# Altium footprint library 7.Connectors&Battary_holders.PcbLib: 133 footprints (part 5 of 9)
Each footprint in its own frame and in the unit in brackets; x right, y up, seen from the top. Pads: shape width x height; smd on the part's side, far side on the other; paste and mask are expansions set on the pad; w line width, h text height; cw(c..) or ccw(c..) is an arc to the next point about the centre after c.
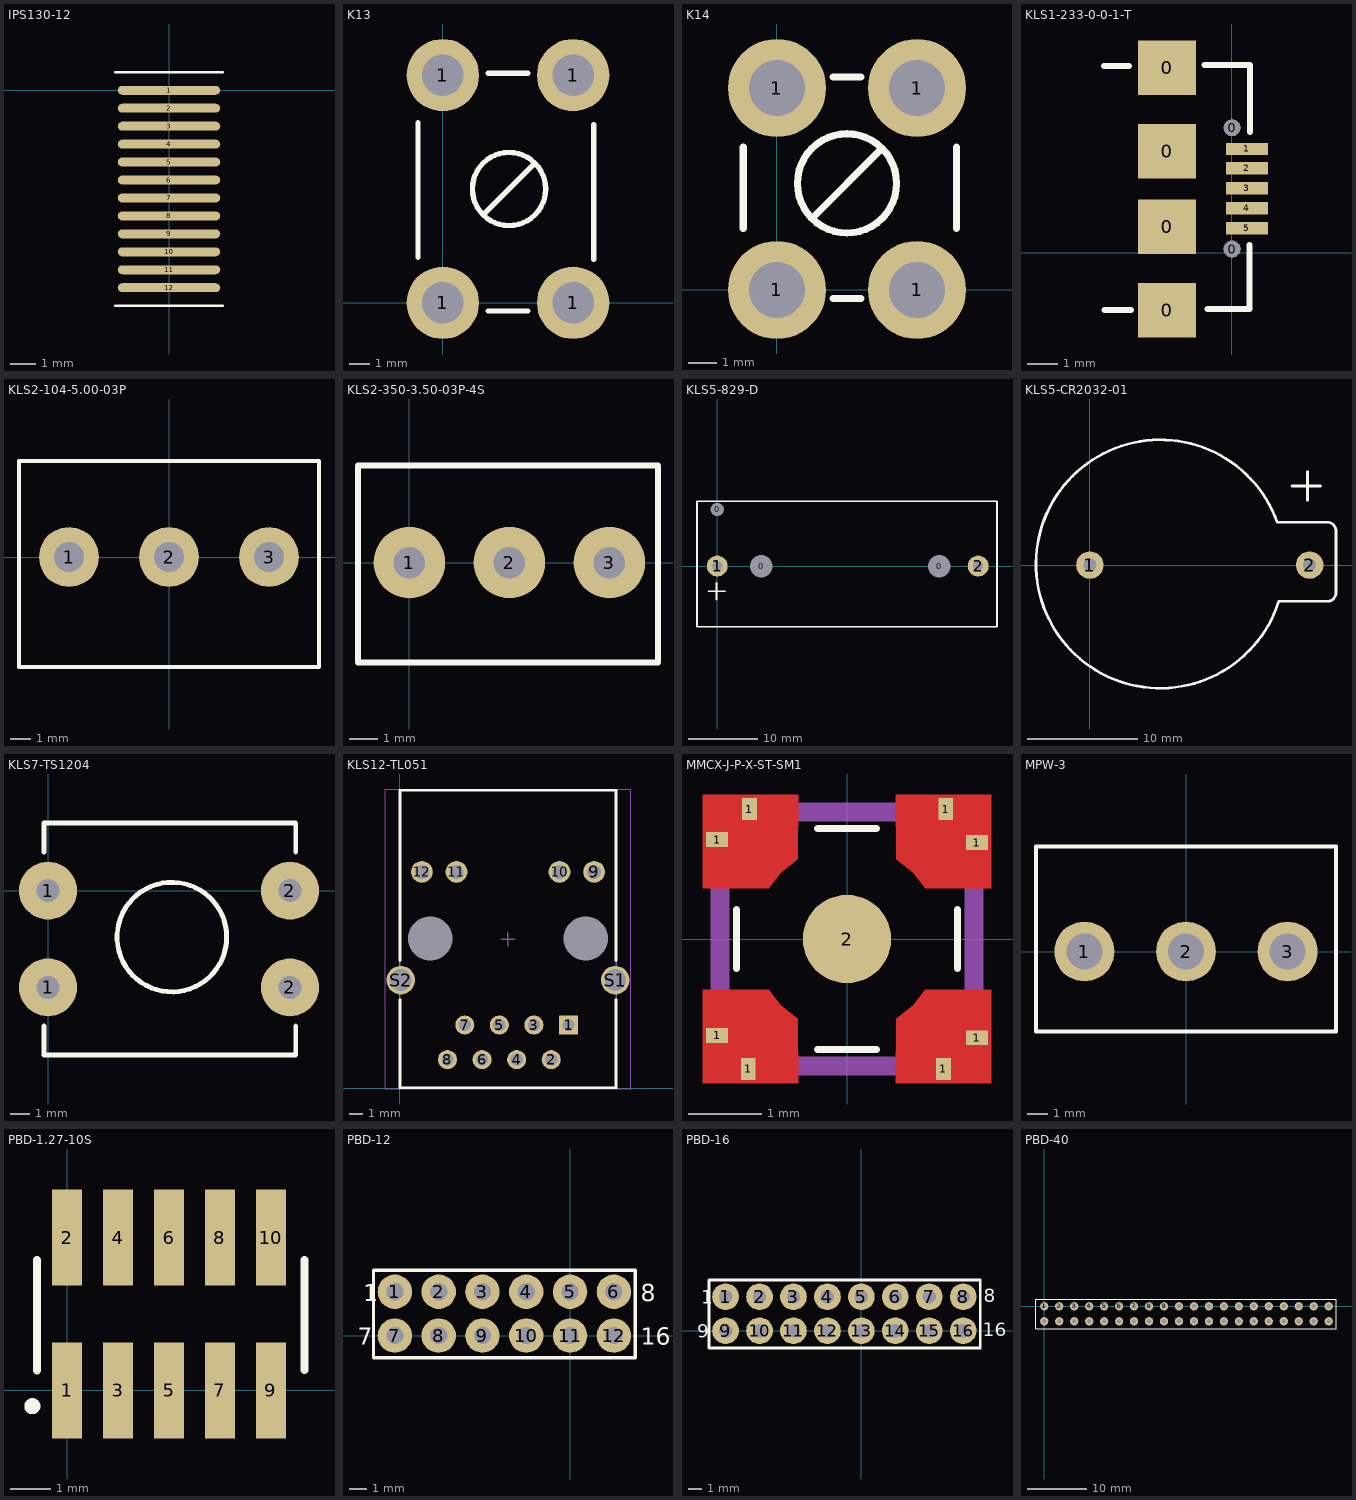
[diagram p4: the footprints below, top view; thin cyan lines are the x and y axes]

## IPS130-12 [mm]
pads (12):
  oval 4x0.35 smd: 1(0,0) 2(0,-0.7) 3(0,-1.4) 4(0,-2.1) 5(0,-2.8) 6(0,-3.5) 7(0,-4.2) 8(0,-4.9) 9(0,-5.6) 10(0,-6.3) 11(0,-7) 12(0,-7.7)
Top Overlay:
  lines w0.1: -2.1,-8.4 2.1,-8.4 ; -2.1,0.7 2.1,0.7

## K13 [mm]
pads (4):
  round 3.5 hole 2: 1(0,0) 1(0,11) 1(6.3,0) 1(6.3,11)
Top Overlay:
  circle w0.254: c3.2,5.5 r1.769
  lines w0.254: -1.2,2.2 -1.2,8.7 ; 1.95,4.25 4.4,6.7 ; 2.2,-0.4 4.1,-0.4 ; 2.2,11.1 4.1,11.1 ; 7.3,2.1 7.3,8.6
3D body: height 5, standoff 0, extent -1.2,-0.2 7.4,11.2

## K14 [mm]
pads (4):
  round 3.5 hole 2: 1(0,0) 1(0,7.2) 1(5,0) 1(5,7.2)
Top Overlay:
  circle w0.254: c2.5,3.8 r1.769
  lines w0.254: -1.2,2.2 -1.2,5.1 ; 1.25,2.55 3.7,5 ; 2,-0.3 3,-0.3 ; 2,7.6 3,7.6 ; 6.4,2.2 6.4,5.1
3D body "User Library-K14 Tin.step": height 9.71, standoff -4.6, extent -1.5,-0.4 6.5,7.6

## KLS1-233-0-0-1-T [mm]
pads (11):
  rect 1.9x1.8 smd: 0(-2.131,-1.892) 0(-2.131,0.858) 0(-2.131,3.358) 0(-2.131,6.108)
  round 0.55 hole 0.55: 0(0.016,0.127) 0(0.016,4.127)
  rect 1.4x0.4 smd: 1(0.508,3.429) 2(0.508,2.794) 3(0.508,2.134) 4(0.508,1.473) 5(0.508,0.813)
Top Overlay:
  lines w0.2: -4.216,6.172 -3.378,6.172 ; -4.191,-1.88 -3.327,-1.88 ; -0.889,6.198 0.584,6.198 ; -0.787,-1.854 0.584,-1.854 0.584,0.254 ; 0.61,3.988 0.61,6.198
3D body "User Library-10104110.step": height 2.77, standoff -0.26, extent -4.976,-1.88 0.588,6.198

## KLS2-104-5.00-03P [mm]
pads (3):
  round 3 hole 1.5: 1(-5,0) 2(0,0) 3(5,0)
Top Overlay:
  lines w0.2: -7.5,-5.5 7.5,-5.5 7.5,4.8 -7.5,4.8 -7.5,-5.5
3D body "terminal_blocks_a-tb500t203sb.stp": height 16.3, standoff -2.8, extent -7.5,-7.551 8.05,6.151

## KLS2-350-3.50-03P-4S [mm]
pads (3):
  round 2.5 hole 1.1: 1(0,0) 2(3.5,0) 3(7,0)
Top Overlay:
  lines w0.2: -1.8,-3.5 8.7,-3.5 8.7,3.4 -1.8,3.4 -1.8,-3.5
3D body "User Library-KF350-3P.STEP": height 9, standoff -2.4, extent -1.8,-3.45 8.7,3.45

## KLS5-829-D [mm]
pads (5):
  round 1.524 hole 1.9: 0(0,8.12)
  round 1.524 hole 3.2: 0(6.3,0) 0(31.8,0)
  round 3 hole 1.45: 1(0,0) 2(37.4,0)
Top Overlay:
  lines w0.254: -1.3,-3.6 1.1,-3.6 ; -0.1,-4.8 -0.1,-2.4 ; -2.9,-8.7 40.1,-8.7 40.1,9.3 -2.9,9.3 -2.9,-8.7
3D body "CR123A  Battery Holder.step": height 16.75, standoff -1.75, extent -3.12,-8.85 40.2,9.4

## KLS5-CR2032-01 [mm]
pads (2):
  round 2.5 hole 1.2: 1(0,0) 2(20,0)
Top Overlay:
  lines w0.25: 17.051,3.896 ccw(c6.4,0.1) 17.156,-3.386 ; 17.1,3.9 21.6,3.9 cw(c21.6,3.1) 22.4,3.1 22.4,0.3 22.4,-2.5 cw(c21.6,-2.5) 21.6,-3.3 17.2,-3.3 ; 18.4,7.2 21,7.2 ; 19.8,5.9 19.8,8.5
3D body "User Library-CH25-2032.step": height 8.7, standoff -2.7, extent -5.1,-11.4 22.4,11.399

## KLS7-TS1204 [mm]
pads (4):
  round 3 hole 1.2: 1(0,-5) 1(0,0) 2(12.5,-5) 2(12.5,0)
Top Overlay:
  circle w0.254: c6.4,-2.4 r2.83
  lines w0.254: -0.2,-7 -0.2,-8.5 12.8,-8.5 12.8,-7 ; -0.2,2 -0.2,3.5 12.8,3.5 12.8,2
3D body "12mmx12mm With White cap round.stp": height 11.8, standoff -1.25, extent -0.567,-9 12.85,4

## KLS12-TL051 [mm]
pads (16):
  rect 1.4x1.4 hole 0.9: 1(12.387,4.642)
  round 1.4 hole 0.9: 2(11.117,2.102) 3(9.847,4.642) 4(8.577,2.102) 5(7.307,4.642) 6(6.037,2.102) 7(4.767,4.642) 8(3.497,2.102)
  round 1.6 hole 1.02: 9(14.267,15.892) 10(11.727,15.892) 11(4.157,15.892) 12(1.617,15.892)
  round 0 hole 3.25 unplated: MH1(13.657,10.992) MH2(2.227,10.992)
  round 2.1 hole 1.6: S1(15.817,7.942) S2(0.067,7.942)
Top Overlay:
  lines w0.2: 0.002,6.493 0.002,0.042 15.882,0.042 ; 0.002,9.39 0.002,21.882 15.882,21.882 ; 15.882,0.042 15.882,6.493 ; 15.882,9.39 15.882,21.882
Mechanical 13:
  lines w0.1: 0.002,0.042 0.002,21.882 15.882,21.882 15.882,0.042 0.002,0.042
Mechanical 15:
  lines w0.05: -1.083,-0.058 16.967,-0.058 16.967,21.982 -1.083,21.982 -1.083,-0.058
  lines w0.1: 7.442,10.932 8.442,10.932 ; 7.942,10.432 7.942,11.432
3D body "7499010211A.stp": height 13.5, standoff -3.05, extent 0.002,0.042 15.882,21.882

## MMCX-J-P-X-ST-SM1 [mm] "0734152061"
pads (9):
  rect 0.3x0.2 smd mask+0: 1(-1.763,-1.31) 1(-1.763,1.35) 1(1.763,-1.34) 1(1.763,1.31)
  rect 0.2x0.3 smd mask+0: 1(-1.34,-1.763) 1(-1.325,1.763) 1(1.31,-1.763) 1(1.34,1.763)
  round 1.2 smd mask+0.05: 2(0,0)
Top Layer:
  region: -1.059,0.688 -1.962,0.688 -1.962,1.962 -0.663,1.962 -0.667,1.08 -0.901,0.901 -1.062,0.69
  region: 1.059,0.688 1.962,0.688 1.962,1.962 0.663,1.962 0.667,1.08 0.901,0.901 1.062,0.69
  region: -1.059,-0.688 -1.962,-0.688 -1.962,-1.962 -0.663,-1.962 -0.667,-1.08 -0.901,-0.901 -1.062,-0.69
  region: 1.059,-0.688 1.962,-0.688 1.962,-1.962 0.663,-1.962 0.667,-1.08 0.901,-0.901 1.062,-0.69
Top Overlay:
  lines w0.1: -1.5,-0.4 -1.5,0.4 ; -0.4,-1.5 0.4,-1.5 ; -0.4,1.5 0.4,1.5 ; 1.5,-0.4 1.5,0.4
Top Paste:
  region: -1.059,0.688 -1.962,0.688 -1.962,1.962 -0.663,1.962 -0.667,1.08 -0.901,0.901 -1.062,0.69
  region: 1.059,0.688 1.962,0.688 1.962,1.962 0.663,1.962 0.667,1.08 0.901,0.901 1.062,0.69
  region: -1.059,-0.688 -1.962,-0.688 -1.962,-1.962 -0.663,-1.962 -0.667,-1.08 -0.901,-0.901 -1.062,-0.69
  region: 1.059,-0.688 1.962,-0.688 1.962,-1.962 0.663,-1.962 0.667,-1.08 0.901,-0.901 1.062,-0.69
Top Solder:
  region: -1.017,0.613 -2.037,0.613 -2.037,2.037 -0.588,2.037 -0.593,1.04 -0.599,1.037 -0.847,0.847 -1.025,0.616
  region: 1.017,0.613 2.037,0.613 2.037,2.037 0.588,2.037 0.593,1.04 0.599,1.037 0.847,0.847 1.025,0.616
  region: -1.017,-0.613 -2.037,-0.613 -2.037,-2.037 -0.588,-2.037 -0.593,-1.04 -0.599,-1.037 -0.847,-0.847 -1.025,-0.616
  region: 1.017,-0.613 2.037,-0.613 2.037,-2.037 0.588,-2.037 0.593,-1.04 0.599,-1.037 0.847,-0.847 1.025,-0.616
Mechanical 1:
  lines w0.254: -1.725,-1.725 1.725,-1.725 1.725,1.725 -1.725,1.725 -1.725,-1.725
  text "J1" at -0.37,-0.377 h0.5
3D body "MMCX-J-P-H-ST-SM1.stp": height 5, standoff 0, extent -1.725,-1.75 1.725,1.75

## MPW-3 [mm]
pads (3):
  round 3 hole 1.8: 1(-5.08,0) 2(0,0) 3(5.08,0)
Top Overlay:
  lines w0.2: -7.5,-4 -7.5,5.25 7.5,5.25 7.5,-4 -7.5,-4
3D body "User Library-MPW-3.step": height 13.8, standoff -3.6, extent -7.5,-4.706 7.5,5.2

## PBD-1.27-10S [mm]
pads (10):
  rect 0.75x2.4 smd: 1(0,0) 2(0,3.81) 3(1.27,0) 4(1.27,3.81) 5(2.54,0) 6(2.54,3.81) 7(3.81,0) 8(3.81,3.81) 9(5.08,0) 10(5.08,3.81)
Top Overlay:
  circle w0.2: c-0.867,-0.394 r0.1
  lines w0.2: -0.75,0.5 -0.75,3.25 ; 5.92,0.507 5.92,3.257
3D body "User Library-PBD1_27-xx-S.step": height 4.5, standoff 0, extent -0.609,-0.546 5.741,4.454

## PBD-12 [mm]
pads (12):
  round 2 hole 1: 1(-10.16,2.54) 2(-7.62,2.54) 3(-5.08,2.54) 4(-2.54,2.54) 5(0,2.54) 6(2.54,2.54) 7(-10.16,0) 8(-7.62,0) 9(-5.08,0) 10(-2.54,0) 11(0,0) 12(2.54,0)
Top Overlay:
  lines w0.2: -11.4,-1.3 -11.4,3.8 3.78,3.8 3.78,-1.3 -11.4,-1.3
  text "16" at 4.1,-0.525 h1
  text "7" at -12.3,-0.525 h1
  text "8" at 4.1,2 h1
  text "1" at -12,2 h1
3D body "User Library-PBD_(DS1023-2)_2line_connectors_h=5_0_8_5mm_step_2_54mm_fixed.step": height 8.5, standoff -3, extent -11.68,-1.21 4.06,3.79

## PBD-16 [mm]
pads (16):
  round 2 hole 1: 1(-10.16,2.54) 2(-7.62,2.54) 3(-5.08,2.54) 4(-2.54,2.54) 5(0,2.54) 6(2.54,2.54) 7(5.08,2.54) 8(7.62,2.54) 9(-10.16,0) 10(-7.62,0) 11(-5.08,0) 12(-2.54,0) 13(0,0) 14(2.54,0) 15(5.08,0) 16(7.62,0)
Top Overlay:
  lines w0.2: -11.4,-1.3 -11.4,3.8 8.9,3.8 8.9,-1.3 -11.4,-1.3
  text "16" at 9.1,-0.4 h1
  text "9" at -12.3,-0.525 h1
  text "8" at 9.15,2.125 h1
  text "1" at -12,2 h1
3D body "User Library-PBD2_54-10.step": height 8.7, standoff -2.4, extent -11.425,-1.29 1.275,3.79
3D body "User Library-PBD2_54-10.step": height 8.7, standoff -2.4, extent -3.875,-1.28 8.825,3.8

## PBD-40 [mm]
pads (42):
  round 1.4 hole 0.8: 1(0,0) 1(0,0) 2(2.54,0) 3(5.08,0) 4(7.62,0) 5(10.16,0) 6(12.7,0) 7(15.24,0) 8(17.78,0) 9(20.32,0) 10(22.86,0) 11(25.4,0) 12(27.94,0) 13(30.48,0) 14(33.02,0) 15(35.56,0) 16(38.1,0) 17(40.64,0) 18(43.18,0) 19(45.72,0) 20(48.26,0) 22(0,-2.54) 22(0,-2.54) 23(2.54,-2.54) 24(5.08,-2.54) 25(7.62,-2.54) 26(10.16,-2.54) 27(12.7,-2.54) 28(15.24,-2.54) 29(17.78,-2.54) 30(20.32,-2.54) 31(22.86,-2.54) 32(25.4,-2.54) 33(27.94,-2.54) 34(30.48,-2.54) 35(33.02,-2.54) 36(35.56,-2.54) 37(38.1,-2.54) 38(40.64,-2.54) 39(43.18,-2.54) 40(45.72,-2.54) 41(48.26,-2.54)
Top Overlay:
  lines w0.2: -1.4,-3.8 49.5,-3.8 49.5,1.2 48.8,1.2 -1.4,1.2 -1.4,-3.8
3D body "User Library-PBD2_54-40.step": height 8.6, standoff -2.5, extent -1.3,-3.84 49.5,1.24